# Altium footprint library TG102LE4G_A7682_240822.PcbLib: 38 footprints (part 1 of 3)
Each footprint in its own frame and in the unit in brackets; x right, y up, seen from the top. Pads: shape width x height; smd on the part's side, far side on the other; paste and mask are expansions set on the pad; w line width, h text height; cw(c..) or ccw(c..) is an arc to the next point about the centre after c.
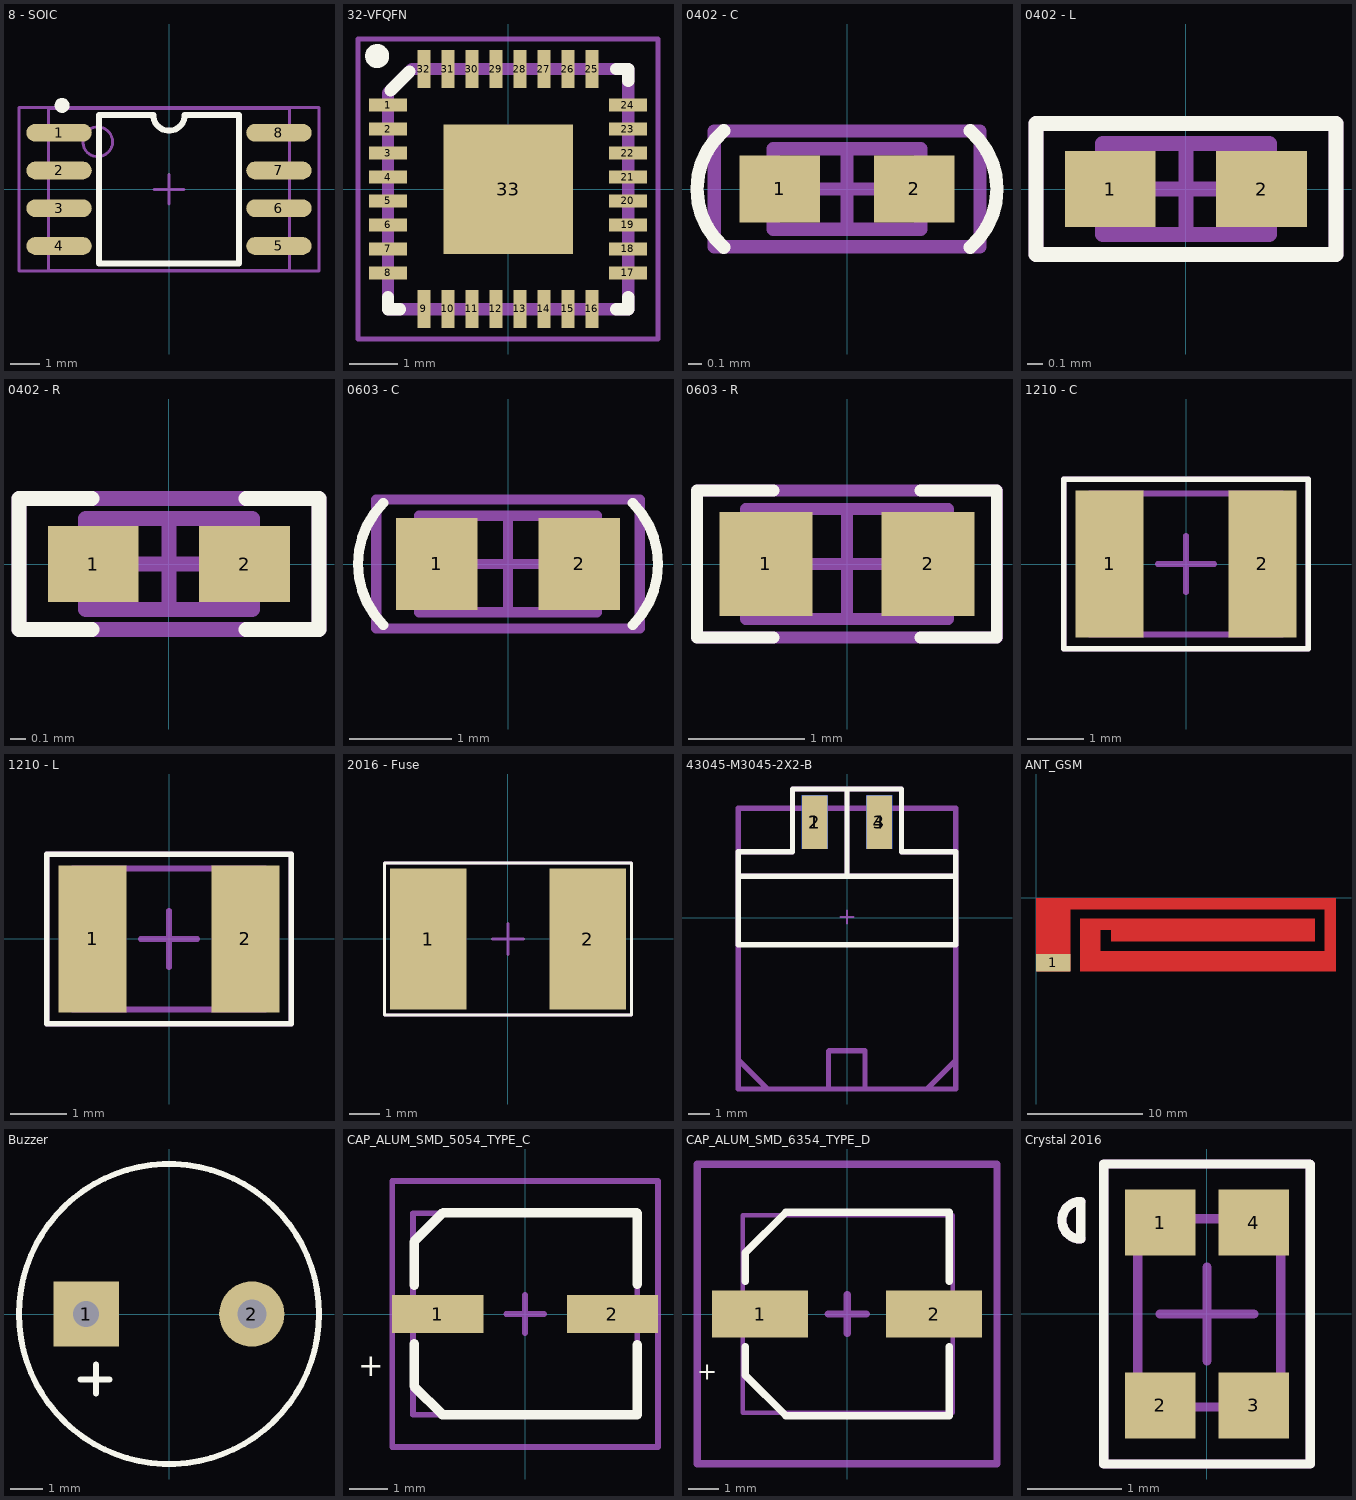
[diagram p0: the footprints below, top view; thin cyan lines are the x and y axes]

## 8 - SOIC [mm] "SOIC, 8-Leads, Body 5.3x3.9mm, Pitch 1.27mm, IPC Medium Density"
height 1.75
pads (8):
  oval 2.2x0.6 smd: 1(-3.7,1.905) 2(-3.7,0.635) 3(-3.7,-0.635) 4(-3.7,-1.905) 5(3.7,-1.905) 6(3.7,-0.635) 7(3.7,0.635) 8(3.7,1.905)
Top Overlay:
  circle w0.25: c-3.6,2.825 r0.125
  lines w0.2: -2.35,-2.5 -2.35,2.5 ; -2.35,-2.5 2.325,-2.5 ; -2.35,2.5 -0.528,2.5 ccw(c0,2.5) 0.527,2.5 2.35,2.5 2.35,-2.5
Mechanical 13:
  circle w0.1: c-2.4,1.6 r0.5
  lines w0.1: -4.05,-2.725 -4.05,2.725 4.05,2.725 4.05,-2.725 -4.05,-2.725
Mechanical 15:
  lines w0.1: -0.5,0 0.5,0 ; 0,-0.5 0,0.5 ; -5.05,-2.75 -5.05,2.75 5.05,2.75 5.05,-2.75 -5.05,-2.75
3D body "User Library-SOIC8_Wide_5mmx5mm.STEP": height 1.75, standoff -0.01, extent -4.077,-2.73 4.025,2.73

## 32-VFQFN [mil] "VFQFN, 32-lead, Body 5x5 mm, 0.5 mm pitch,IPC High Density"
height 35.43
pads (33):
  rect 31.5x11 smd mask+4.5: 1(-98.42,68.89) 2(-98.42,49.21) 3(-98.42,29.53) 4(-98.42,9.84) 5(-98.42,-9.84) 6(-98.42,-29.52) 7(-98.42,-49.21) 8(-98.42,-68.89) 17(98.43,-68.89) 18(98.43,-49.21) 19(98.43,-29.52) 20(98.43,-9.84) 21(98.43,9.84) 22(98.43,29.53) 23(98.43,49.21) 24(98.43,68.89)
  rect 11x31.5 smd mask+4.5: 9(-68.91,-98.42) 10(-49.22,-98.42) 11(-29.54,-98.42) 12(-9.86,-98.42) 13(9.83,-98.42) 14(29.51,-98.42) 15(49.19,-98.42) 16(68.88,-98.42) 25(68.88,98.43) 26(49.19,98.43) 27(29.51,98.43) 28(9.83,98.43) 29(-9.86,98.43) 30(-29.54,98.43) 31(-49.22,98.43) 32(-68.91,98.43)
  rect 106.3x106.3 smd paste-118.11: 33(0.08,-0.06)
Top Overlay:
  circle w9.84: c-107.28,109.06 r4.92
  lines w10: -98.42,-88.71 -98.42,-98.56 -88.57,-98.56 ; -96.47,80.69 -80.74,96.43 ; 88.73,-98.56 98.58,-98.56 98.58,-88.71 ; 88.73,98.44 98.58,98.44 98.58,88.59
Top Paste:
  region: -3.94,-3.94 -51,-3.94 -51,-51 -3.94,-51
  region: 3.95,-4.07 3.95,-51.13 51.02,-51.13 51.02,-4.07
  rectangle: 4.09,3.82 51.15,50.88
  region: -3.8,3.95 -3.8,51.02 -50.87,51.02 -50.87,3.95
Mechanical 13:
  lines w10: -98.42,-98.56 98.58,-98.56 98.58,98.44 -78.72,98.44 -98.42,78.74 -98.42,-98.56
Mechanical 15:
  lines w3.94: -19.68,0 19.69,0 ; 0,-19.68 0,19.68 ; -123.03,-123.03 123.03,-123.03 123.03,123.03 -123.03,123.03 -123.03,-123.03
3D body "User Library-QFN-32UH.STEP": height 29.53, standoff 0, extent -98.81,-98.81 98.83,98.83

## 0402 - C [mm] "Chip Capacitor, Body 1.0x0.5mm, IPC High Density"
height 1.3
pads (2):
  rect 0.6x0.5 smd: 1(-0.5,0) 2(0.5,0)
Top Overlay:
  lines w0.1: -0.917,-0.434 cw(c-0.548,0) -0.917,0.434 ; 0.917,-0.434 ccw(c0.548,0) 0.917,0.434
Mechanical 13:
  lines w0.1: -0.55,-0.3 0.55,-0.3 0.55,0.3 -0.55,0.3 -0.55,-0.3
Mechanical 15:
  lines w0.1: -0.3,0 0.3,0 ; 0,-0.3 0,0.3 ; -0.991,-0.432 -0.991,0.432 0.991,0.432 0.991,-0.432 -0.991,-0.432
3D body "CAP - 0402.STEP": height 0.36, standoff 0, extent -0.5,-0.265 0.5,0.265

## 0402 - L [mm] "Chip Inductor, Body 1.0x0.5mm, IPC High Density"
height 1.3
pads (2):
  rect 0.6x0.5 smd: 1(-0.5,0) 2(0.5,0)
Top Overlay:
  lines w0.1: -0.991,-0.432 -0.991,0.432 0.991,0.432 0.991,-0.432 -0.991,-0.432 ; -0.508,0.432 ccw(c-0.508,0.432) -0.508,0.432
Mechanical 13:
  lines w0.1: -0.55,-0.3 -0.55,0.3 0.55,0.3 0.55,-0.3 -0.55,-0.3
Mechanical 15:
  lines w0.1: -0.3,0 0.3,0 ; 0,-0.3 0,0.3 ; -0.991,-0.432 0.991,-0.432 0.991,0.432 -0.991,0.432 -0.991,-0.432
3D body "INDUCTOR - 0402.STEP": height 0.25, standoff 0, extent -0.5,-0.25 0.5,0.25

## 0402 - R [mm] "Chip Resistor, Body 1.0x0.5mm, IPC High Density"
height 1.3
pads (2):
  rect 0.6x0.5 smd: 1(-0.5,0) 2(0.5,0)
Top Overlay:
  lines w0.1: -0.508,-0.432 -0.991,-0.432 -0.991,0.432 -0.508,0.432 ; 0.509,-0.432 0.991,-0.432 0.991,0.432 0.509,0.432 ; -0.508,0.432 ccw(c-0.508,0.432) -0.508,0.432
Mechanical 13:
  lines w0.1: -0.55,-0.3 0.55,-0.3 0.55,0.3 -0.55,0.3 -0.55,-0.3
Mechanical 15:
  lines w0.1: -0.3,0 0.3,0 ; 0,-0.3 0,0.3 ; -0.991,-0.432 -0.991,0.432 0.991,0.432 0.991,-0.432 -0.991,-0.432
3D body "RES - 0402.STEP": height 0.35, standoff 0, extent -0.5,-0.25 0.5,0.25

## 0603 - C [mm] "Chip Capacitor, Body 1.6x0.8mm, IPC High Density"
height 1.3
pads (2):
  rect 0.8x0.9 smd: 1(-0.7,0) 2(0.7,0)
Top Overlay:
  lines w0.1: -1.226,-0.6 cw(c-0.626,0) -1.226,0.6 ; 1.226,-0.6 ccw(c0.626,0) 1.226,0.6
Mechanical 13:
  lines w0.1: -0.875,-0.475 -0.875,0.475 0.875,0.475 0.875,-0.475 -0.875,-0.475
Mechanical 15:
  lines w0.1: -0.475,0 0.475,0 ; 0,-0.475 0,0.475 ; -1.295,-0.635 -1.295,0.635 1.295,0.635 1.295,-0.635 -1.295,-0.635
3D body "CAP_0603_1608.STEP": height 0.8, standoff 0, extent -0.8,-0.4 0.8,0.4

## 0603 - R [mm] "Chip Resistor, Body 1.6x0.8mm, IPC High Density"
height 1.3
pads (2):
  rect 0.8x0.9 smd paste-0.025: 1(-0.7,0) 2(0.7,0)
Top Overlay:
  lines w0.1: -0.635,-0.635 -1.295,-0.635 -1.295,0.635 -0.635,0.635 ; 0.635,-0.635 1.295,-0.635 1.295,0.635 0.635,0.635
Mechanical 13:
  lines w0.1: -0.875,-0.475 -0.875,0.475 0.875,0.475 0.875,-0.475 -0.875,-0.475
Mechanical 15:
  lines w0.1: -0.475,0 0.475,0 ; 0,-0.475 0,0.475 ; -1.295,-0.635 -1.295,0.635 1.295,0.635 1.295,-0.635 -1.295,-0.635
3D body "RES - 0603 - 1608X05N.STEP": height 0.45, standoff 0, extent -0.775,-0.425 0.775,0.425

## 1210 - C [mm] "Chip Capacitor, Body 3.2x2.5mm, IPC High Density"
height 1.5
pads (2):
  rect 1.2x2.6 smd: 1(-1.35,0) 2(1.35,0)
Top Overlay:
  lines w0.1: -2.159,-1.499 2.159,-1.499 2.159,1.499 -2.159,1.499 -2.159,-1.499
Mechanical 13:
  lines w0.1: -1.7,-1.245 -1.7,1.245 1.7,1.245 1.7,-1.245 -1.7,-1.245
Mechanical 15:
  lines w0.1: -0.5,0 0.5,0 ; 0,-0.5 0,0.5 ; -2.159,-1.499 2.159,-1.499 2.159,1.499 -2.159,1.499 -2.159,-1.499
3D body "CAP - 1210 - 3225.STEP": height 2.5, standoff 0, extent -1.6,-1.25 1.6,1.25

## 1210 - L [mm] "Chip Capacitor, Body 2.54x1.27mm, IPC High Density"
height 1.3
pads (2):
  rect 1.2x2.6 smd: 1(-1.35,0) 2(1.35,0)
Top Overlay:
  lines w0.1: -2.159,-1.499 2.159,-1.499 2.159,1.499 -2.159,1.499 -2.159,-1.499
Mechanical 13:
  lines w0.1: -1.7,-1.245 -1.7,1.245 1.7,1.245 1.7,-1.245 -1.7,-1.245
Mechanical 15:
  lines w0.1: -0.5,0 0.5,0 ; 0,-0.5 0,0.5 ; -2.159,-1.499 2.159,-1.499 2.159,1.499 -2.159,1.499 -2.159,-1.499
3D body "User Library-3225.STEP": height 1.9, standoff 0, extent -1.6,-1.25 1.6,1.25

## 2016 - Fuse [mm] "Chip Resetable Fuse,  Body 5.1x4.2mm, IPC High Density"
height 1.4
pads (2):
  rect 2.5x4.6 smd: 1(-2.6,0) 2(2.6,0)
Top Overlay:
  lines w0.1: -4.039,-2.489 -4.039,2.489 4.039,2.489 4.039,-2.489 -4.039,-2.489
Mechanical 15:
  lines w0.1: -0.5,0 0.5,0 ; 0,-0.5 0,0.5 ; -4.039,-2.489 4.039,-2.489 4.039,2.489 -4.039,2.489 -4.039,-2.489
3D body "User Library-Fuse 2016L.step": height 2, standoff -0.03, extent -2.72,-2.255 2.72,2.255

## 43045-M3045-2X2-B [mm] "Micro-Fit 3.0™ Vertical Angle Header, 3.00mm Pitch, Dual Row, 4 Circuits, with Solder Tab, Gold, Glow Wire Capable, Black"
height 7.37
pads (4):
  rect 1.2x2.5 smd far side: 1(-1.5,4.445) 3(1.5,4.445)
  rect 1.2x2.5 smd: 2(-1.5,4.445) 4(1.5,4.445)
Top Overlay:
  lines w0.254: 0,1.922 0,5.992 ; -5.08,1.922 -5.08,3.071 -2.54,3.071 -2.54,5.992 2.54,5.992 2.54,3.071 5.08,3.071 5.08,1.922 ; -5.08,1.922 -5.08,-1.27 5.08,-1.27 5.08,1.922 ; -5.08,1.922 5.08,1.922
Bottom Overlay:
  lines w0.254: 0,1.922 0,5.992 ; -5.08,1.922 -5.08,3.071 -2.54,3.071 -2.54,5.992 2.54,5.992 2.54,3.071 5.08,3.071 5.08,1.922 ; -5.08,1.922 -5.08,-1.27 5.08,-1.27 5.08,1.922 ; -5.08,1.922 5.08,1.922
Mechanical 13:
  lines w0.254: -5.08,-2.636 -5.08,-6.624 ; -5.08,-2.611 -5.08,1.922 ; 0,1.922 0,5.992 ; 5.08,-2.459 5.08,-6.65 ; -5.08,-6.624 -3.708,-7.996 ; -5.08,-6.624 -5.08,-2.484 -5.08,1.922 ; -5.08,-6.624 -3.708,-7.996 ; -5.08,1.922 -5.08,3.071 -2.54,3.071 -2.54,5.992 2.54,5.992 2.54,3.071 5.08,3.071 5.08,1.922 ; -5.08,1.922 5.08,1.922 ; -5.08,1.922 5.08,1.922 ; -3.708,-7.996 3.734,-7.996 ; -3.708,-7.996 3.734,-7.996 ; -0.864,-7.996 0.787,-7.996 ; -0.864,-7.996 -0.864,-6.243 ; -0.864,-7.996 0.787,-7.996 ; -0.864,-7.996 -0.864,-6.243 ; -0.864,-6.243 -0.838,-6.218 ; -0.864,-6.243 -0.838,-6.218 ; -0.838,-6.218 0.838,-6.218 ; -0.838,-6.218 0.838,-6.218 ; 0.787,-7.996 0.838,-7.945 ; 0.787,-7.996 0.838,-7.945 ; 0.838,-7.945 0.838,-6.218 ; 0.838,-7.945 0.838,-6.218 ; 3.734,-7.996 5.08,-6.65 ; 3.734,-7.996 5.08,-6.65 ; 5.08,-6.65 5.08,-2.484 ; 5.08,-2.484 5.08,1.922 ; 5.08,-2.484 5.08,1.922
Mechanical 15:
  lines w0.1: -0.3,0.023 0.3,0.023 ; 0,-0.277 0,0.323
  lines w0.254: -5.08,4.976 -5.08,-7.996 5.08,-7.996 5.08,4.976 ; -5.08,5.102 5.08,5.102
3D body "m3045-2x2_asm.stp": height 3.62, standoff -5.2, extent -4.86,-7.972 4.86,5.685

## ANT_GSM [mm] "Antenna GSM PCB"
height 1.035
pads (1):
  rect 3x1.5 smd mask+0.102: 1(1.5,-5.64)
Top Layer:
  rectangle: 0,-1 26,0
  rectangle: 0,-6.4 3,0
  rectangle: 25,-6.4 26,0
  rectangle: 3.8,-6.4 26,-4.6
  rectangle: 3.8,-6.4 5.6,-1.8
  rectangle: 3.8,-2.801 24.2,-1.801
  rectangle: 6.5,-3.801 24.2,-1.801

## Buzzer [mm] "Buzer 9mm"
height 12.7
pads (2):
  rect 2x2 hole 0.8: 1(-2.54,0)
  round 2 hole 0.889: 2(2.54,0)
Top Overlay:
  circle w0.178: c0,0 r4.6
  lines w0.178: -2.718,-2.007 -1.829,-2.007 ; -2.235,-2.438 -2.235,-1.549
3D body "Buzzer_9mm.STEP": height 5.6, standoff -5.4, extent -4.55,-4.55 4.55,4.55

## CAP_ALUM_SMD_5054_TYPE_C [mm]
pads (2):
  rect 2.4x1 smd paste-0.05: 1(-2.3,0) 2(2.3,0)
Top Overlay:
  lines w0.254: -2.921,-0.787 -2.921,-1.905 -2.176,-2.65 2.95,-2.65 2.95,-0.813 ; -2.921,0.762 -2.921,1.905 -2.159,2.667 2.932,2.667 ; 2.95,0.787 2.95,2.65
  text "+" at -4.4,-1.837 h1
Top 3D Body:
  lines w0.15: -0.5,0 0.5,0 ; 0,-0.5 0,0.5 ; -2.95,-2.65 2.95,-2.65 2.95,2.65 -2.95,2.65 -2.95,-2.65
Top Courtyard:
  lines w0.15: -3.5,-3.5 -3.5,3.5 3.5,3.5 3.5,-3.5 -3.5,-3.5
  text ".Designator" at -2.474,-0.442 h1
3D body "User Library-ALU-C.STEP": height 5.41, standoff 0, extent -2.95,-2.65 2.95,2.65

## CAP_ALUM_SMD_6354_TYPE_D [mm] "Capacitor, Aluminum Electrolytic; 6.60 mm L X 6.60 mm W X 5.40 mm H body"
height 5.4
pads (2):
  rect 3.2x1.58 smd paste-0.1: 1(-2.9,0) 2(2.9,0)
Top Overlay:
  lines w0.25: -3.4,-1.092 -3.4,-2.04 -2.04,-3.4 3.4,-3.4 3.4,-1.092 ; -3.4,1.092 -3.4,2.04 -2.04,3.4 3.4,3.4 3.4,1.092
  text "+" at -5.008,-2.386 h1
Top 3D Body:
  lines w0.15: -3.475,-3.3 -3.475,3.3 3.525,3.3 3.525,-3.3 -3.475,-3.3
  lines w0.25: -0.635,0 0.635,0 ; 0,-0.635 0,0.635
Top Courtyard:
  lines w0.25: -5,-5 -5,5 5,5 5,-5 -5,-5
  text ".Designator" at -5.786,-0.731 h1
3D body "CAPAE660X540D780L260X65.STEP": height 5.4, standoff 0, extent -3.475,-3.3 3.525,3.3

## Crystal 2016 [mm] "Surface Mount,4-SMD, No Lead (DFN, LCC),2.00mm x 1.60mm"
height 0.7
pads (4):
  rect 0.75x0.7 smd mask+0.119: 1(-0.5,0.975) 2(-0.5,-0.975) 3(0.5,-0.975) 4(0.5,0.975)
Top Overlay:
  lines w0.1: -1.346,0.799 cw(c-1.346,0.999) -1.346,1.199 -1.346,0.799 ; -1.099,-1.599 1.099,-1.599 1.099,1.593 1.094,1.598 -1.099,1.598 -1.099,-1.599
Mechanical 1:
  lines w0.1: -1.346,0.799 cw(c-1.346,0.999) -1.346,1.199
Mechanical 13:
  lines w0.1: -0.737,-0.991 0.787,-0.991 0.787,1.016 -0.737,1.016 -0.737,-0.991
Mechanical 15:
  lines w0.1: -0.5,0 0.5,0 ; 0,-0.5 0,0.5 ; -1.099,-1.599 -1.099,1.598 1.094,1.598 1.099,1.593 1.099,-1.599 -1.099,-1.599
3D body "User Library-NT2016SA-END4910A-48MHZ Crystal (NDK).STEP": height 0.7, standoff 0, extent -0.771,-0.985 0.829,1.015